# Altium footprint library AD常用3D封装.PCBLIB: 343 footprints (part 3 of 22)
Each footprint in its own frame and in the unit in brackets; x right, y up, seen from the top. Pads: shape width x height; smd on the part's side, far side on the other; paste and mask are expansions set on the pad; w line width, h text height; cw(c..) or ccw(c..) is an arc to the next point about the centre after c.
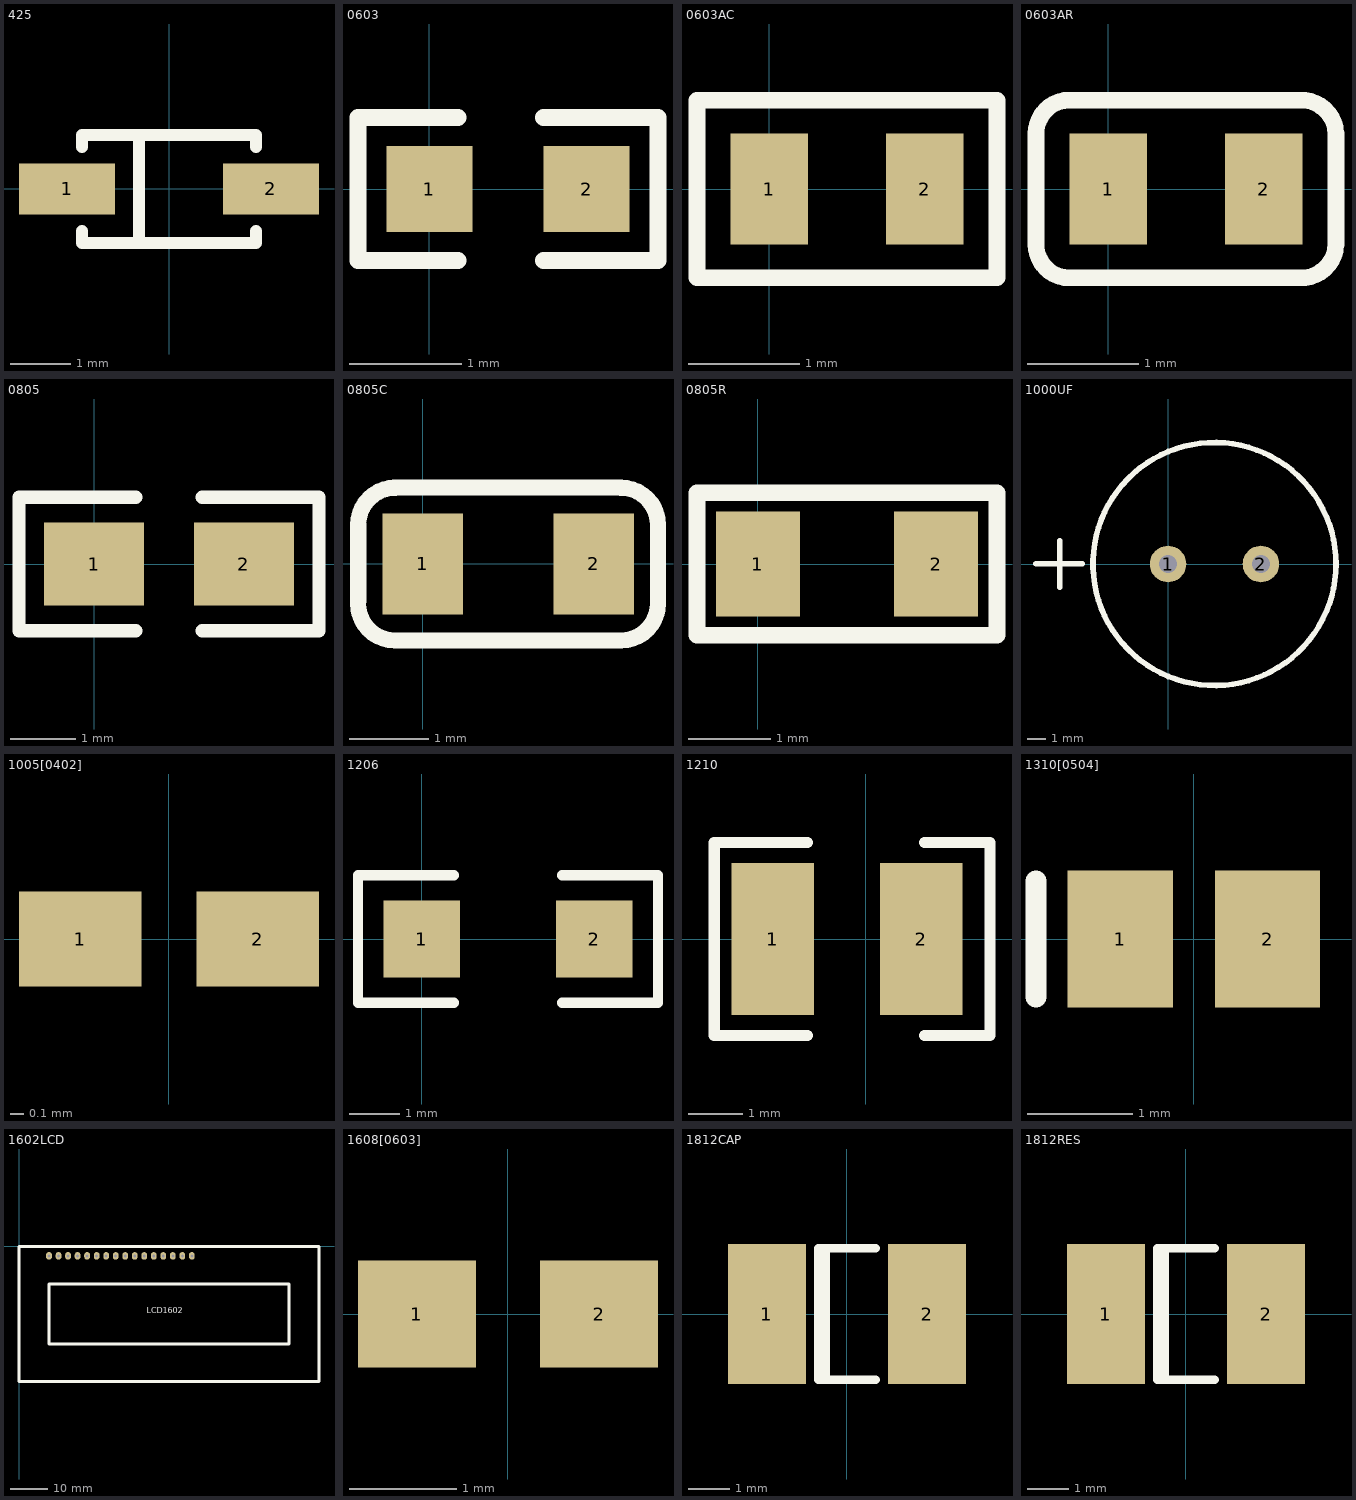
[diagram p2: the footprints below, top view; thin cyan lines are the x and y axes]

## 425 [mm] "SOD-123; 2 Leads; Body 2.7 x 1.6 mm, (LxW)"
height 1.35
pads (2):
  rect 1.6x0.85 smd: 1(-1.7,0) 2(1.7,0)
TopOverlay:
  lines w0.2: -1.45,-0.7 -1.45,-0.9 1.45,-0.9 1.45,-0.7 ; -1.45,0.7 -1.45,0.9 1.45,0.9 1.45,0.7 ; -0.5,-0.9 -0.5,0.9
3D body: height 1.2, standoff 0, extent -1.675,-0.787 1.625,0.813

## 0603 [mil] "贴片0603"
pads (2):
  rect 30x30 smd: 1(0,0) 2(55,0)
TopOverlay:
  lines w6: 10,-25 -25,-25 -25,25 10,25 ; 40,-25 80,-25 80,25 40,25

## 0603AC [mm]
pads (2):
  rect 0.7x1 smd: 1(0,0) 2(1.4,0)
TopOverlay:
  lines w0.15: -0.65,-0.8 2.05,-0.8 2.05,0.8 -0.65,0.8 -0.65,-0.8
3D body: height 0.3, standoff 0, extent -0.089,-0.381 1.511,0.419

## 0603AR [mm]
pads (2):
  rect 0.7x1 smd: 1(0,0) 2(1.4,0)
TopOverlay:
  lines w0.15: 2.05,0.475 2.05,-0.5 cw(c1.737,-0.487) 1.725,-0.8 -0.35,-0.8 cw(c-0.35,-0.5) -0.65,-0.5 -0.65,0.5 cw(c-0.35,0.5) -0.35,0.8 1.725,0.8 cw(c1.737,0.487) 2.05,0.5
3D body: height 0.3, standoff 0, extent -0.1,-0.4 1.5,0.4

## 0805 [mil]
pads (2):
  rect 60x50 smd: 1(0,0) 2(90,0)
TopOverlay:
  lines w8: 25,-40 -45,-40 -45,40 25,40 ; 65,-40 135,-40 135,40 65,40
3D body: height 21.65, standoff 0, extent 5.64,-24.8 84.38,24.81

## 0805C [mil]
height 39.37
pads (2):
  rect 40x50 smd: 1(0,0) 2(85,0)
TopOverlay:
  lines w8: -32.11,-19.59 ccw(c-13.7,-19.59) -13.7,-38 ; -32,-18.5 -32,18.5 ; -32,19.5 cw(c-13.59,19.5) -13.59,37.91 ; -14.12,38 98.09,38 ; -12.7,-38 98.11,-38 ; 98.59,-38 ccw(c98.59,-19.59) 117,-19.59 ; 98.59,37.91 cw(c98.59,19.5) 117,19.5 ; 117,-18.59 117,18.5
3D body: height 30.39, standoff -0.39, extent 3.15,-24.61 81.89,24.61

## 0805R [mil]
height 39.37
pads (2):
  rect 40x50 smd: 1(0,0) 2(85,0)
TopOverlay:
  lines w8: -29,-34 114,-34 114,34 -29,34 -29,-34
3D body: height 30.39, standoff -0.39, extent 3.26,-24.61 82,24.61

## 1000UF [mm]
pads (2):
  round 2 hole 1: 1(0,0) 2(5.08,0)
TopOverlay:
  circle w0.305: c2.54,0 r6.65
  lines w0.305: -7.227,0.025 -4.687,0.025 ; -5.927,-1.27 -5.927,1.27

## 1005[0402] [mm] "Chip Resistor; Body 1.1 x 0.5 mm (LxW typ)"
height 2.54
pads (2):
  rect 0.9x0.7 smd: 1(-0.65,0) 2(0.65,0)
3D body: height 0.41, standoff 0, extent -0.575,-0.275 0.575,0.275

## 1206 [mil]
pads (2):
  rect 60x60 smd: 1(0,0) 2(135,0)
TopOverlay:
  lines w8: 25,-50 -50,-50 -50,50 25,50 ; 110,-50 185,-50 185,50 110,50
3D body: height 23.62, standoff 0, extent 4.01,-30.49 130,32.5

## 1210 [mil]
pads (2):
  rect 60x110 smd: 1(-67.5,0) 2(40,0)
TopOverlay:
  lines w8: -42.5,-70 -110,-70 -110,70 -42.5,70 ; 42.5,-70 90,-70 90,70 42.5,70

## 1310[0504] [mm] "Chip Capacitor; Body 1.2 x 1.0 mm (LxW typ)"
height 1.35
pads (2):
  rect 1x1.3 smd: 1(-0.7,0) 2(0.7,0)
TopOverlay:
  lines w0.2: -1.5,-0.55 -1.5,0.55

## 1602LCD [mil] "LCD module 16*2 char"
pads (16):
  oval 60x80 hole 30: 1(314.96,-98.43) 2(414.96,-98.43) 3(514.96,-98.43) 4(614.96,-98.43) 5(714.96,-98.43) 6(814.96,-98.43) 7(914.96,-98.43) 8(1014.96,-98.43) 9(1114.96,-98.43) 10(1214.96,-98.43) 11(1314.96,-98.43) 12(1414.96,-98.43) 13(1514.96,-98.43) 14(1614.96,-98.43) 15(1714.96,-98.43) 16(1814.96,-98.43)
TopOverlay:
  lines w30: 0,-1417.32 0,0 3149.61,0 3149.61,-1417.32 0,-1417.32 ; 314.96,-1023.62 314.96,-393.7 2834.65,-393.7 2834.65,-1023.62 314.96,-1023.62
  text "LCD1602" at 1340,-700 h60
3D body: height 414, standoff -106, extent 2.36,-1456.5 3171.65,-19.49

## 1608[0603] [mm] "Chip Capacitor; Body 1.6 x 0.8 mm (LxW typ)"
height 1.35
pads (2):
  rect 1.1x1 smd: 1(-0.85,0) 2(0.85,0)
3D body: height 0.45, standoff 0, extent -0.749,-0.425 0.801,0.425

## 1812CAP [mm] "Chip Capacitor; Body 4.5 x 3.2 mm (LxW typ)"
height 1.1
pads (2):
  rect 1.9x3.4 smd: 1(-1.95,0) 2(1.95,0)
TopOverlay:
  lines w0.2: -0.51,-1.6 -0.51,1.6 ; 0.7,-1.6 -0.7,-1.6 -0.7,1.6 0.7,1.6
3D body: height 1.6, standoff 0, extent -2.199,-1.574 2.301,1.626

## 1812RES [mm] "Chip Capacitor; Body 4.5 x 3.2 mm (LxW typ)"
height 1.1
pads (2):
  rect 1.9x3.4 smd: 1(-1.95,0) 2(1.95,0)
TopOverlay:
  lines w0.2: -0.51,-1.6 -0.51,1.6 ; 0.7,-1.6 -0.7,-1.6 -0.7,1.6 0.7,1.6
3D body: height 1.6, standoff 0, extent -2.224,-1.625 2.276,1.575